# Altium schematic symbol library LATTICEPLDS_Library.SchLib: 291 symbols (part 10 of 32) (continued)
## LFE2M-50-F484_SDT (continued)
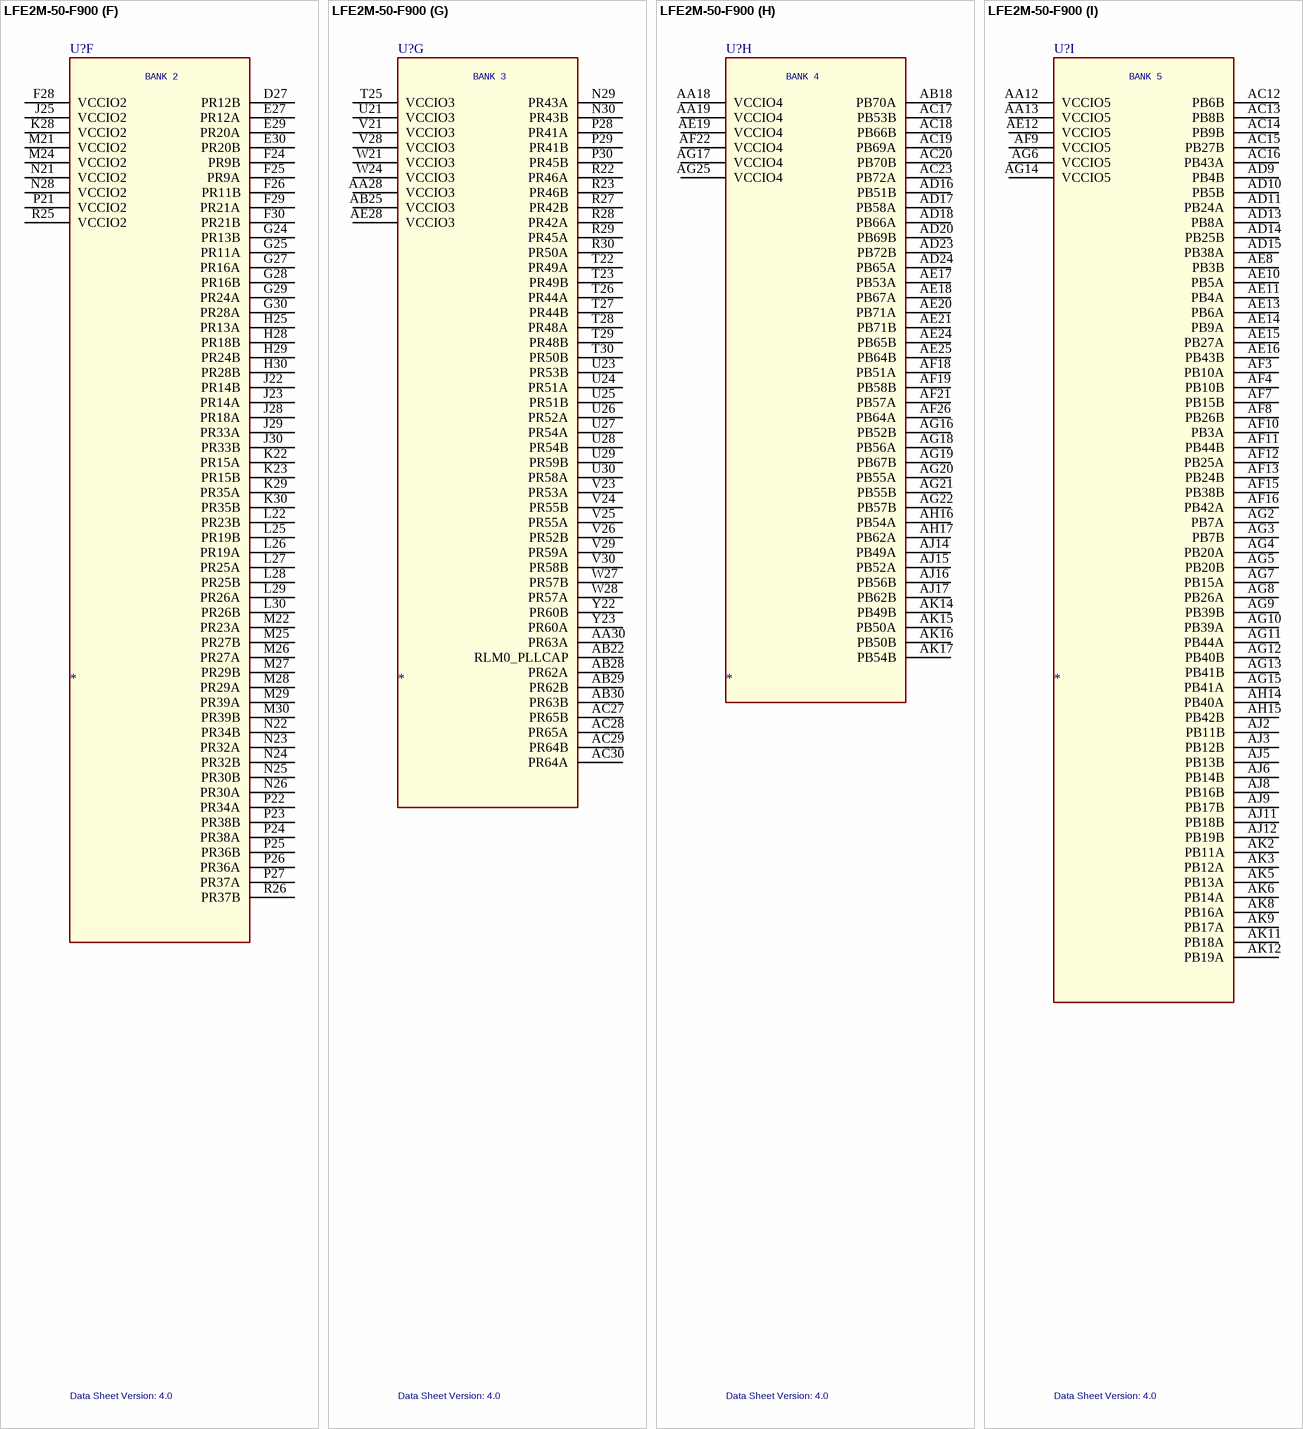
[diagram p110: symbol LFE2M-50-F900]

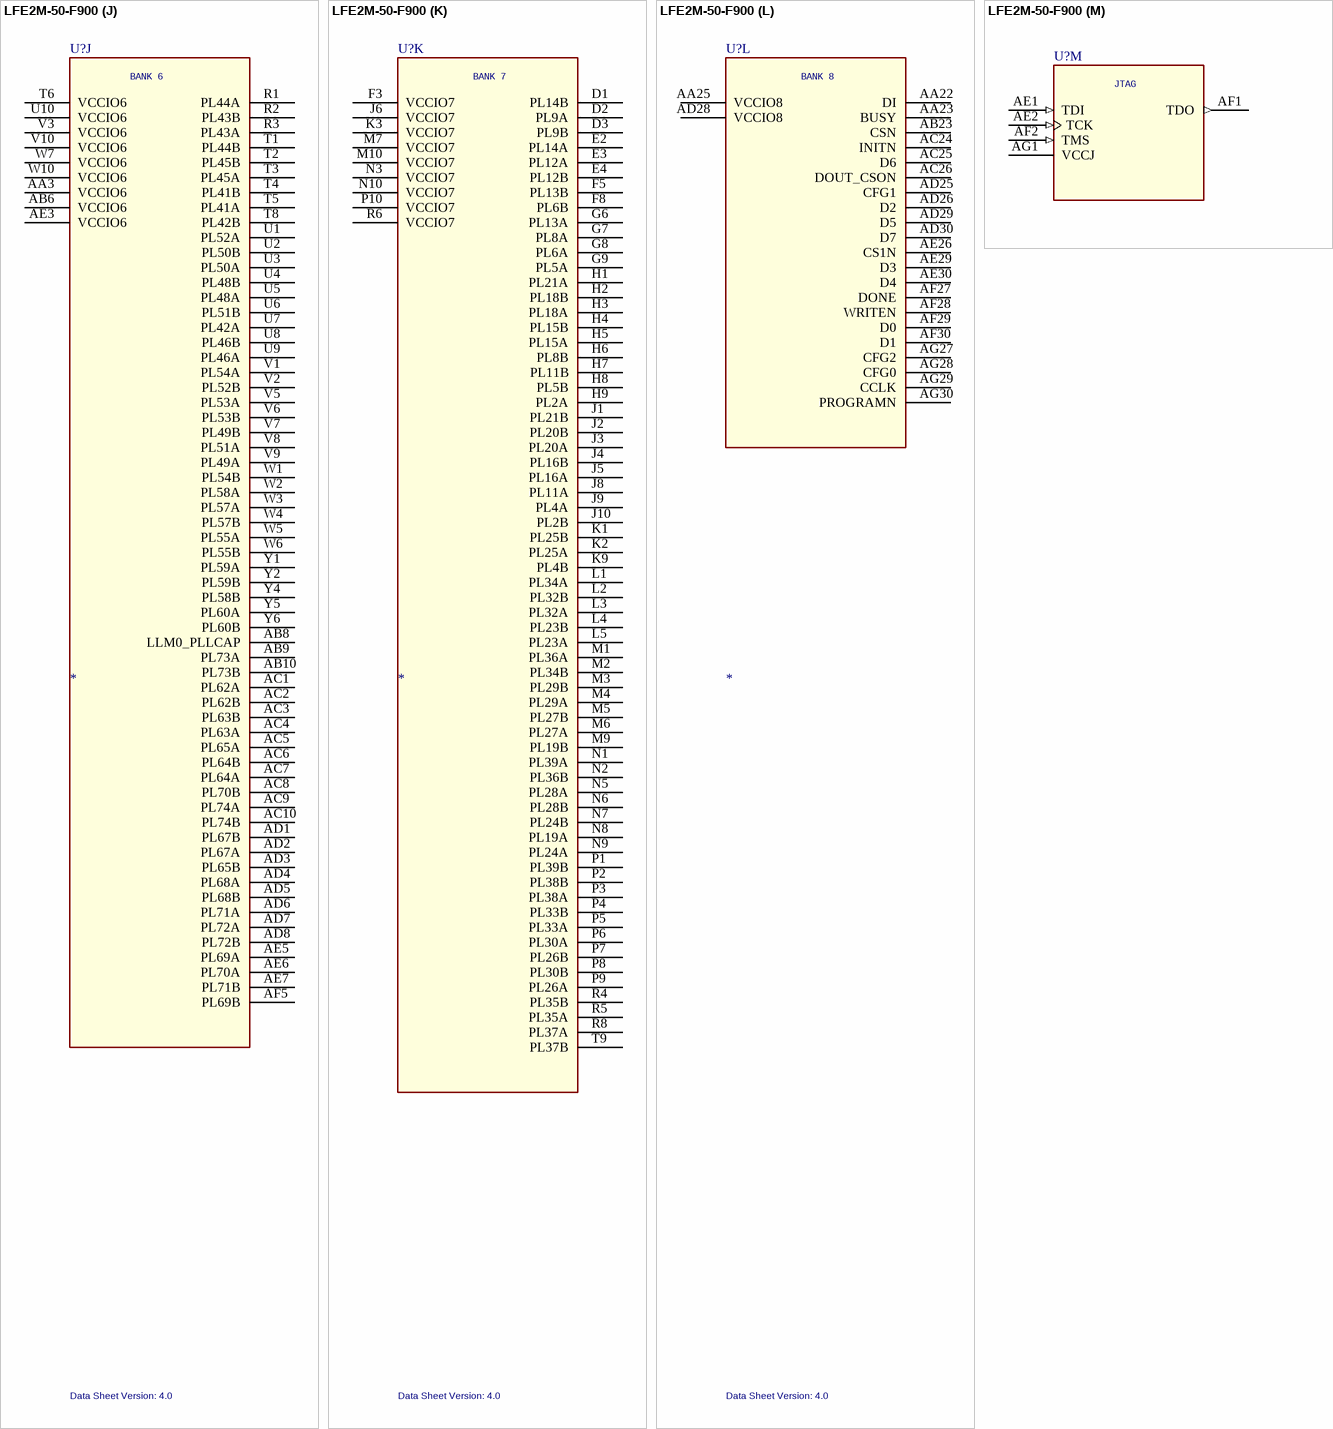
[diagram p111: symbol LFE2M-50-F900]

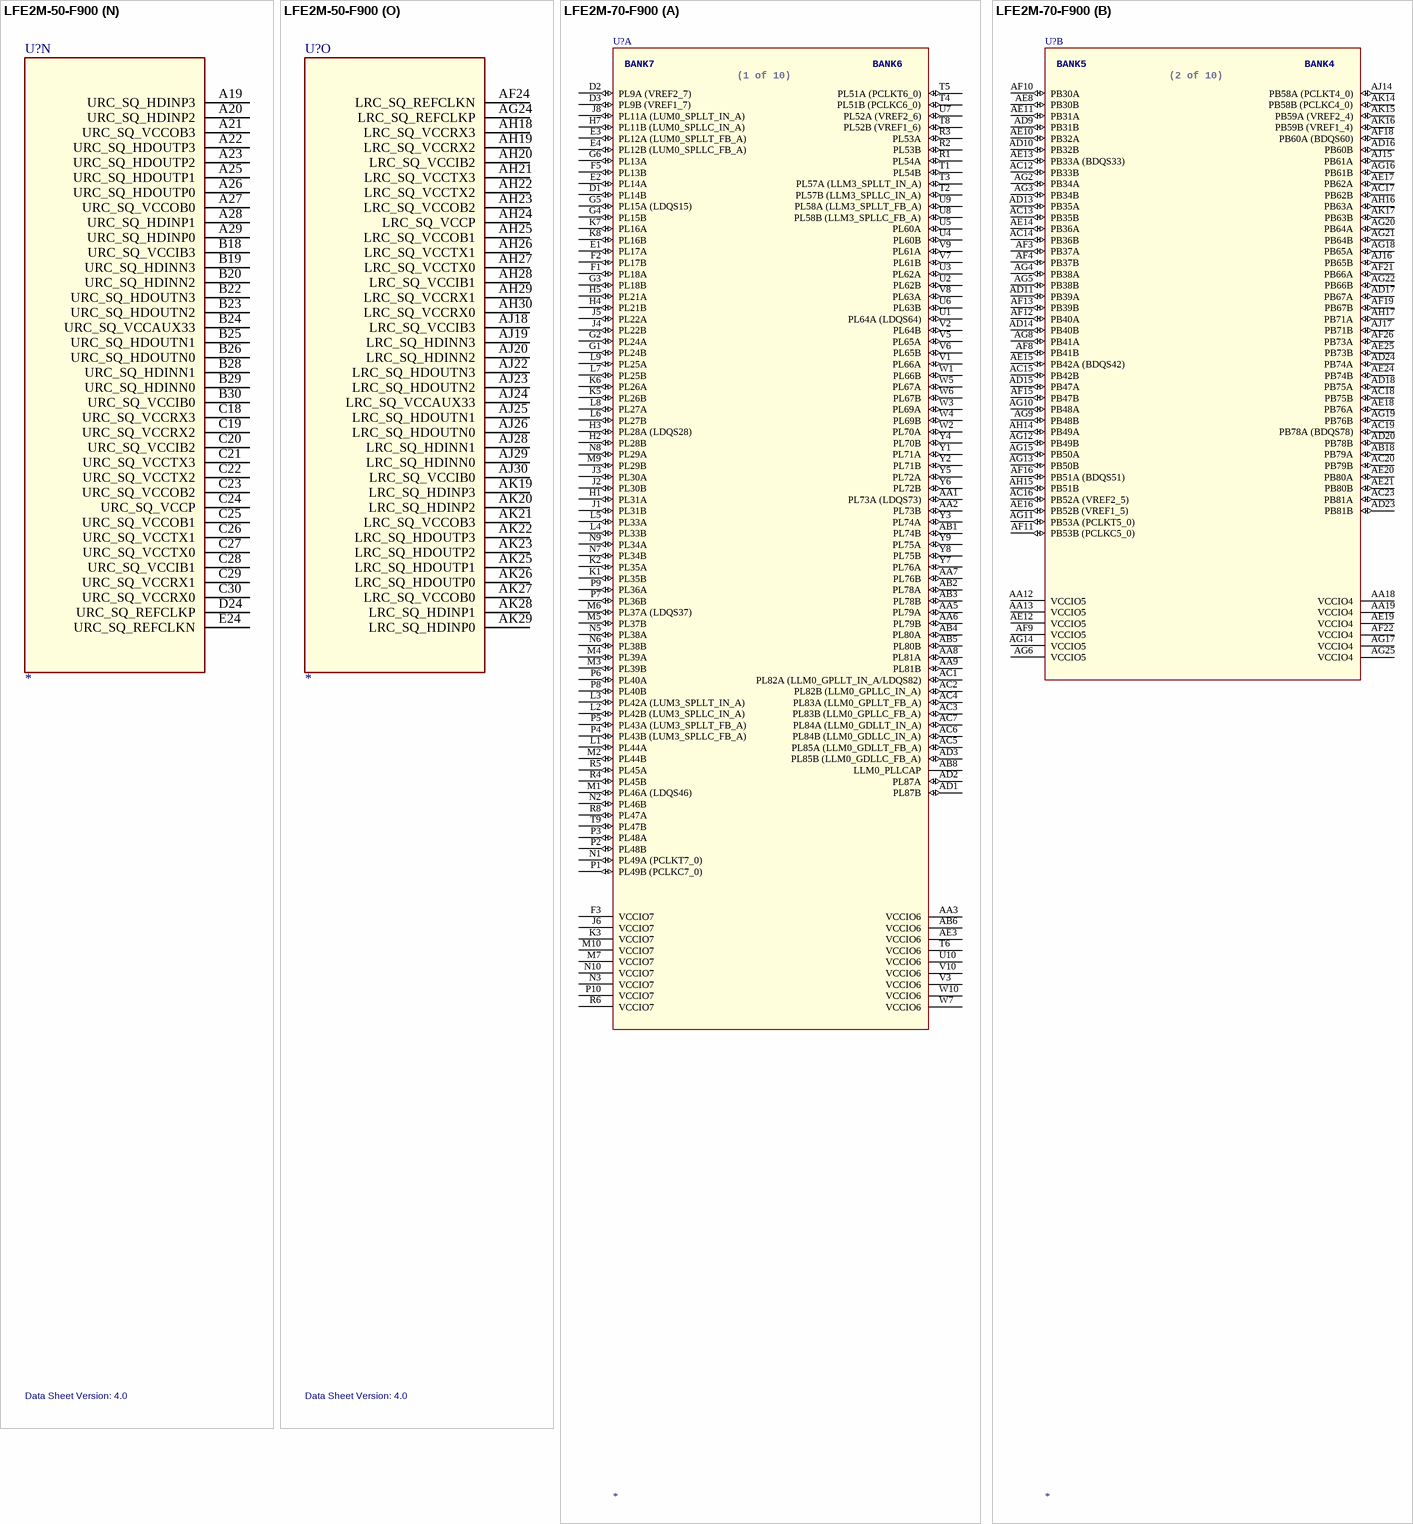
[diagram p112: symbols LFE2M-50-F900 to LFE2M-70-F900]

## LFE2M-50-F900
designator U?  Data Sheet Version: 4.0
SPLIT_INST: TRUE; SWAP_INFO: (S1+S2+S3+S4+S5+S6+S7+S8+S9+S10+S11+S12+S13+S14+S15)
part A pins: AA10 VCCAUX (power), AA11 VCCAUX (power), AA20 VCCAUX (power), AA21 VCCAUX (power), AH1 VCC (power), AH2 VCC (power), AH4 VCC (power), AH5 VCC (power), AH7 VCC (power), AH9 VCC (power), AH10 VCC (power), AH12 VCC (power), AH13 VCC (power), AJ7 VCCAUX (power), B7 VCCAUX (power), C1 VCC (power), C2 VCC (power), C4 VCC (power), C5 VCC (power), C7 VCC (power), C9 VCC (power), C10 VCC (power), C12 VCC (power), C13 VCC (power), G23 XRES, K10 VCCAUX (power), K11 VCCAUX (power), K20 VCCAUX (power), K21 VCCAUX (power), L10 VCCAUX (power), L11 VCCAUX (power), L12 VCC (power), L13 VCC (power), L18 VCC (power), L19 VCC (power), L20 VCCAUX (power), L21 VCCAUX (power), M11 VCC (power), M12 VCC (power), M13 VCC (power), M14 VCC (power), M15 VCC (power), M16 VCC (power), M17 VCC (power), M18 VCC (power), M19 VCC (power), M20 VCC (power), N11 VCC (power), N12 VCC (power), N13 VCCPLL (power), N18 VCCPLL (power), N19 VCC (power), N20 VCC (power), P12 VCC (power), P19 VCC (power), R12 VCC (power), R19 VCC (power), T12 VCC (power), T19 VCC (power), U12 VCC (power), U19 VCC (power), V11 VCC (power), V12 VCC (power), V13 VCCPLL (power), V18 VCCPLL (power), V19 VCC (power), V20 VCC (power), W11 VCC (power), W12 VCC (power), W13 VCC (power), W14 VCC (power), W15 VCC (power), W16 VCC (power), W17 VCC (power), W18 VCC (power), W19 VCC (power), W20 VCC (power), Y10 VCCAUX (power), Y11 VCCAUX (power), Y12 VCC (power), Y13 VCC (power), Y18 VCC (power), Y19 VCC (power), Y20 VCCAUX (power), Y21 VCCAUX (power)
part B pins: A1 GND (power), A7 GND (power), A13 GND (power), A18 GND (power), A24 GND (power), A30 GND (power), AA4 GND (power), AA14 GND (power), AA15 GND (power), AA16 GND (power), AA17 GND (power), AA24 GND (power), AA27 GND (power), AB7 GND (power), AB24 GND (power), AD12 GND (power), AD19 GND (power), AD27 GND (power), AE4 GND (power), AE9 GND (power), AE22 GND (power), AE27 GND (power), AF6 GND (power), AF14 GND (power), AF17 GND (power), AF25 GND (power), AJ4 GND (power), AJ10 GND (power), AJ21 GND (power), AJ27 GND (power), AK1 GND (power), AK7 GND (power), AK13 GND (power), AK18 GND (power), AK24 GND (power), AK30 GND (power), B4 GND (power), B10 GND (power), B21 GND (power), B27 GND (power), D6 GND (power), D25 GND (power), E14 GND (power), E17 GND (power), F4 GND (power), F9 GND (power), F22 GND (power), F27 GND (power), G12 GND (power), G19 GND (power), J7 GND (power), J24 GND (power), K4 GND (power), K14 GND (power), K15 GND (power), K16 GND (power), K17 GND (power), K27 GND (power), L14 GND (power), L15 GND (power), L16 GND (power), L17 GND (power), M8 GND (power), M23 GND (power), N4 GND (power), N14 GND (power), N15 GND (power), N16 GND (power), N17 GND (power), N27 GND (power), P11 GND (power), P13 GND (power), P14 GND (power), P15 GND (power), P16 GND (power), P17 GND (power), P18 GND (power), P20 GND (power), R7 GND (power), R10 GND (power), R11 GND (power), R13 GND (power), R14 GND (power), R15 GND (power), R16 GND (power), R17 GND (power), R18 GND (power), R20 GND (power), R21 GND (power), R24 GND (power), T7 GND (power), T10 GND (power), T11 GND (power), T13 GND (power), T14 GND (power), T15 GND (power), T16 GND (power), T17 GND (power), T18 GND (power), T20 GND (power), T21 GND (power), T24 GND (power), U11 GND (power), U13 GND (power), U14 GND (power), U15 GND (power), U16 GND (power), U17 GND (power), U18 GND (power), U20 GND (power), V4 GND (power), V14 GND (power), V15 GND (power), V16 GND (power), V17 GND (power), V27 GND (power), W8 GND (power), W23 GND (power), Y14 GND (power), Y15 GND (power), Y16 GND (power), Y17 GND (power)
part C pins: A4 NC, A10 NC, AA1 NC, AA2 NC, AA5 NC, AA6 NC, AA7 NC, AA8 NC, AA9 NC, AA26 NC, AA29 NC, AB1 NC, AB2 NC, AB3 NC, AB4 NC, AB5 NC, AB11 NC, AB12 NC, AB13 NC, AB14 NC, AB15 NC, AB16 NC, AB17 NC, AB19 NC, AB20 NC, AB21 NC, AB26 NC, AB27 NC, AC11 NC, AC21 NC, AC22 NC, AD21 NC, AD22 NC, AE23 NC, AF20 NC, AF23 NC, AG23 NC, AG26 NC, AH3 NC, AH6 NC, AH8 NC, AH11 NC, AJ1 NC, AJ13 NC, AK4 NC, AK10 NC, B1 NC, B13 NC, C3 NC, C6 NC, C8 NC, C11 NC, D28 NC, D29 NC, D30 NC, E1 NC, E28 NC, F1 NC, F2 NC, F17 NC, F18 NC, F20 NC, F23 NC, G1 NC, G2 NC, G3 NC, G4 NC, G5 NC, G10 NC, G20 NC, G21 NC, G26 NC, H17 NC, H19 NC, H20 NC, H21 NC, H22 NC, H23 NC, H24 NC, H26 NC, H27 NC, J17 NC, J18 NC, J19 NC, J20 NC, J21 NC, J26 NC, J27 NC, K5 NC, K6 NC, K7 NC, K8 NC, K24 NC, K25 NC, K26 NC, L6 NC, L7 NC, L8 NC, L9 NC, L23 NC, L24 NC, R9 NC, U22 NC, V22 NC, W9 NC, W22 NC, W25 NC, W26 NC, W29 NC, W30 NC, Y3 NC, Y7 NC, Y8 NC, Y9 NC, Y24 NC, Y25 NC, Y26 NC, Y27 NC, Y28 NC, Y29 NC, Y30 NC
part D pins: A2 PT11A, A3 PT12A, A5 PT13A, A6 PT14A, A8 PT18A, A9 PT17A, A11 PT16A, A12 PT19A, A14 PT42B, B2 PT11B, B3 PT12B, B5 PT13B, B6 PT14B, B8 PT18B, B9 PT17B, B11 PT16B, B12 PT19B, B14 PT42A, C14 PT45B, C15 PT46B, D4 PT38B, D5 PT38A, D7 PT15A, D8 PT34A, D9 PT30A, D10 PT10A, D11 PT4A, D12 PT28B, D13 PT41B, D14 VCCIO0 (power), D15 PT46A, E5 PT37B, E6 VCCIO0 (power), E7 PT15B, E8 PT30B, E9 VCCIO0 (power), E10 PT9B, E11 PT10B, E12 PT4B, E13 PT28A, E15 PT45A, F6 PT37A, F7 PT34B, F10 PT9A, F11 PT3A, F12 VCCIO0 (power), F13 PT41A, F14 PT43B, G11 PT32A, G13 PT40B, G14 PT44B, H10 PT5A, H11 PT3B, H12 PT31A, H13 PT31B, H14 PT43A, J11 PT40A, J12 PT5B, J13 PT32B, J14 PT44A
part E pins: A15 PT48B, A16 PT54B, A17 PT64B, B15 PT48A, B16 PT54A, B17 PT64A, C16 PT50B, C17 PT65A, D16 PT50A, D17 VCCIO1 (power), D18 PT65B, D19 PT66B, D20 PT68B, D21 PT68A, D22 PT70B, D23 PT73B, D26 PT72B, E16 PT47A, E18 PT66A, E19 PT67A, E20 PT67B, E21 PT73A, E22 VCCIO1 (power), E23 PT71B, E25 VCCIO1 (power), E26 PT72A, F15 PT47B, F16 PT52A, F19 VCCIO1 (power), F21 PT70A, G15 PT51A, G16 PT53A, G17 PT53B, G18 PT69B, G22 PT71A, H15 PT49A, H16 PT52B, H18 PT69A, J15 PT49B, J16 PT51B, K12 VCCIO0 (power), K13 VCCIO0 (power), K18 VCCIO1 (power), K19 VCCIO1 (power)
part F pins: D27 PR12B, E27 PR12A, E29 PR20A, E30 PR20B, F24 PR9B, F25 PR9A, F26 PR11B, F28 VCCIO2 (power), F29 PR21A, F30 PR21B, G24 PR13B, G25 PR11A, G27 PR16A, G28 PR16B, G29 PR24A, G30 PR28A, H25 PR13A, H28 PR18B, H29 PR24B, H30 PR28B, J22 PR14B, J23 PR14A, J25 VCCIO2 (power), J28 PR18A, J29 PR33A, J30 PR33B, K22 PR15A, K23 PR15B, K28 VCCIO2 (power), K29 PR35A, K30 PR35B, L22 PR23B, L25 PR19B, L26 PR19A, L27 PR25A, L28 PR25B, L29 PR26A, L30 PR26B, M21 VCCIO2 (power), M22 PR23A, M24 VCCIO2 (power), M25 PR27B, M26 PR27A, M27 PR29B, M28 PR29A, M29 PR39A, M30 PR39B, N21 VCCIO2 (power), N22 PR34B, N23 PR32A, N24 PR32B, N25 PR30B, N26 PR30A, N28 VCCIO2 (power), P21 VCCIO2 (power), P22 PR34A, P23 PR38B, P24 PR38A, P25 PR36B, P26 PR36A, P27 PR37A, R25 VCCIO2 (power), R26 PR37B
part G pins: AA28 VCCIO3 (power), AA30 PR63A, AB22 RLM0_PLLCAP, AB25 VCCIO3 (power), AB28 PR62A, AB29 PR62B, AB30 PR63B, AC27 PR65B, AC28 PR65A, AC29 PR64B, AC30 PR64A, AE28 VCCIO3 (power), N29 PR43A, N30 PR43B, P28 PR41A, P29 PR41B, P30 PR45B, R22 PR46A, R23 PR46B, R27 PR42B, R28 PR42A, R29 PR45A, R30 PR50A, T22 PR49A, T23 PR49B, T25 VCCIO3 (power), T26 PR44A, T27 PR44B, T28 PR48A, T29 PR48B, T30 PR50B, U21 VCCIO3 (power), U23 PR53B, U24 PR51A, U25 PR51B, U26 PR52A, U27 PR54A, U28 PR54B, U29 PR59B, U30 PR58A, V21 VCCIO3 (power), V23 PR53A, V24 PR55B, V25 PR55A, V26 PR52B, V28 VCCIO3 (power), V29 PR59A, V30 PR58B, W21 VCCIO3 (power), W24 VCCIO3 (power), W27 PR57B, W28 PR57A, Y22 PR60B, Y23 PR60A
part H pins: AA18 VCCIO4 (power), AA19 VCCIO4 (power), AB18 PB70A, AC17 PB53B, AC18 PB66B, AC19 PB69A, AC20 PB70B, AC23 PB72A, AD16 PB51B, AD17 PB58A, AD18 PB66A, AD20 PB69B, AD23 PB72B, AD24 PB65A, AE17 PB53A, AE18 PB67A, AE19 VCCIO4 (power), AE20 PB71A, AE21 PB71B, AE24 PB65B, AE25 PB64B, AF18 PB51A, AF19 PB58B, AF21 PB57A, AF22 VCCIO4 (power), AF26 PB64A, AG16 PB52B, AG17 VCCIO4 (power), AG18 PB56A, AG19 PB67B, AG20 PB55A, AG21 PB55B, AG22 PB57B, AG25 VCCIO4 (power), AH16 PB54A, AH17 PB62A, AJ14 PB49A, AJ15 PB52A, AJ16 PB56B, AJ17 PB62B, AK14 PB49B, AK15 PB50A, AK16 PB50B, AK17 PB54B
part I pins: AA12 VCCIO5 (power), AA13 VCCIO5 (power), AC12 PB6B, AC13 PB8B, AC14 PB9B, AC15 PB27B, AC16 PB43A, AD9 PB4B, AD10 PB5B, AD11 PB24A, AD13 PB8A, AD14 PB25B, AD15 PB38A, AE8 PB3B, AE10 PB5A, AE11 PB4A, AE12 VCCIO5 (power), AE13 PB6A, AE14 PB9A, AE15 PB27A, AE16 PB43B, AF3 PB10A, AF4 PB10B, AF7 PB15B, AF8 PB26B, AF9 VCCIO5 (power), AF10 PB3A, AF11 PB44B, AF12 PB25A, AF13 PB24B, AF15 PB38B, AF16 PB42A, AG2 PB7A, AG3 PB7B, AG4 PB20A, AG5 PB20B, AG6 VCCIO5 (power), AG7 PB15A, AG8 PB26A, AG9 PB39B, AG10 PB39A, AG11 PB44A, AG12 PB40B, AG13 PB41B, AG14 VCCIO5 (power), AG15 PB41A, AH14 PB40A, AH15 PB42B, AJ2 PB11B, AJ3 PB12B, AJ5 PB13B, AJ6 PB14B, AJ8 PB16B, AJ9 PB17B, AJ11 PB18B, AJ12 PB19B, AK2 PB11A, AK3 PB12A, AK5 PB13A, AK6 PB14A, AK8 PB16A, AK9 PB17A, AK11 PB18A, AK12 PB19A
part J pins: AA3 VCCIO6 (power), AB6 VCCIO6 (power), AB8 LLM0_PLLCAP, AB9 PL73A, AB10 PL73B, AC1 PL62A, AC2 PL62B, AC3 PL63B, AC4 PL63A, AC5 PL65A, AC6 PL64B, AC7 PL64A, AC8 PL70B, AC9 PL74A, AC10 PL74B, AD1 PL67B, AD2 PL67A, AD3 PL65B, AD4 PL68A, AD5 PL68B, AD6 PL71A, AD7 PL72A, AD8 PL72B, AE3 VCCIO6 (power), AE5 PL69A, AE6 PL70A, AE7 PL71B, AF5 PL69B, R1 PL44A, R2 PL43B, R3 PL43A, T1 PL44B, T2 PL45B, T3 PL45A, T4 PL41B, T5 PL41A, T6 VCCIO6 (power), T8 PL42B, U1 PL52A, U2 PL50B, U3 PL50A, U4 PL48B, U5 PL48A, U6 PL51B, U7 PL42A, U8 PL46B, U9 PL46A, U10 VCCIO6 (power), V1 PL54A, V2 PL52B, V3 VCCIO6 (power), V5 PL53A, V6 PL53B, V7 PL49B, V8 PL51A, V9 PL49A, V10 VCCIO6 (power), W1 PL54B, W2 PL58A, W3 PL57A, W4 PL57B, W5 PL55A, W6 PL55B, W7 VCCIO6 (power), W10 VCCIO6 (power), Y1 PL59A, Y2 PL59B, Y4 PL58B, Y5 PL60A, Y6 PL60B
part K pins: D1 PL14B, D2 PL9A, D3 PL9B, E2 PL14A, E3 PL12A, E4 PL12B, F3 VCCIO7 (power), F5 PL13B, F8 PL6B, G6 PL13A, G7 PL8A, G8 PL6A, G9 PL5A, H1 PL21A, H2 PL18B, H3 PL18A, H4 PL15B, H5 PL15A, H6 PL8B, H7 PL11B, H8 PL5B, H9 PL2A, J1 PL21B, J2 PL20B, J3 PL20A, J4 PL16B, J5 PL16A, J6 VCCIO7 (power), J8 PL11A, J9 PL4A, J10 PL2B, K1 PL25B, K2 PL25A, K3 VCCIO7 (power), K9 PL4B, L1 PL34A, L2 PL32B, L3 PL32A, L4 PL23B, L5 PL23A, M1 PL36A, M2 PL34B, M3 PL29B, M4 PL29A, M5 PL27B, M6 PL27A, M7 VCCIO7 (power), M9 PL19B, M10 VCCIO7 (power), N1 PL39A, N2 PL36B, N3 VCCIO7 (power), N5 PL28A, N6 PL28B, N7 PL24B, N8 PL19A, N9 PL24A, N10 VCCIO7 (power), P1 PL39B, P2 PL38B, P3 PL38A, P4 PL33B, P5 PL33A, P6 PL30A, P7 PL26B, P8 PL30B, P9 PL26A, P10 VCCIO7 (power), R4 PL35B, R5 PL35A, R6 VCCIO7 (power), R8 PL37A, T9 PL37B
part L pins: AA22 DI, AA23 BUSY, AA25 VCCIO8 (power), AB23 CSN, AC24 INITN, AC25 D6, AC26 DOUT_CSON, AD25 CFG1, AD26 D2, AD28 VCCIO8 (power), AD29 D5, AD30 D7, AE26 CS1N, AE29 D3, AE30 D4, AF27 DONE, AF28 WRITEN, AF29 D0, AF30 D1, AG27 CFG2, AG28 CFG0, AG29 CCLK, AG30 PROGRAMN
part M pins: AE1 TDI (in), AE2 TCK (in), AF1 TDO (out), AF2 TMS (in), AG1 VCCJ (power)
part N pins: A19 URC_SQ_HDINP3, A20 URC_SQ_HDINP2, A21 URC_SQ_VCCOB3, A22 URC_SQ_HDOUTP3, A23 URC_SQ_HDOUTP2, A25 URC_SQ_HDOUTP1, A26 URC_SQ_HDOUTP0, A27 URC_SQ_VCCOB0, A28 URC_SQ_HDINP1, A29 URC_SQ_HDINP0, B18 URC_SQ_VCCIB3, B19 URC_SQ_HDINN3, B20 URC_SQ_HDINN2, B22 URC_SQ_HDOUTN3, B23 URC_SQ_HDOUTN2, B24 URC_SQ_VCCAUX33, B25 URC_SQ_HDOUTN1, B26 URC_SQ_HDOUTN0, B28 URC_SQ_HDINN1, B29 URC_SQ_HDINN0, B30 URC_SQ_VCCIB0, C18 URC_SQ_VCCRX3, C19 URC_SQ_VCCRX2, C20 URC_SQ_VCCIB2, C21 URC_SQ_VCCTX3, C22 URC_SQ_VCCTX2, C23 URC_SQ_VCCOB2, C24 URC_SQ_VCCP, C25 URC_SQ_VCCOB1, C26 URC_SQ_VCCTX1, C27 URC_SQ_VCCTX0, C28 URC_SQ_VCCIB1, C29 URC_SQ_VCCRX1, C30 URC_SQ_VCCRX0, D24 URC_SQ_REFCLKP, E24 URC_SQ_REFCLKN
part O pins: AF24 LRC_SQ_REFCLKN, AG24 LRC_SQ_REFCLKP, AH18 LRC_SQ_VCCRX3, AH19 LRC_SQ_VCCRX2, AH20 LRC_SQ_VCCIB2, AH21 LRC_SQ_VCCTX3, AH22 LRC_SQ_VCCTX2, AH23 LRC_SQ_VCCOB2, AH24 LRC_SQ_VCCP, AH25 LRC_SQ_VCCOB1, AH26 LRC_SQ_VCCTX1, AH27 LRC_SQ_VCCTX0, AH28 LRC_SQ_VCCIB1, AH29 LRC_SQ_VCCRX1, AH30 LRC_SQ_VCCRX0, AJ18 LRC_SQ_VCCIB3, AJ19 LRC_SQ_HDINN3, AJ20 LRC_SQ_HDINN2, AJ22 LRC_SQ_HDOUTN3, AJ23 LRC_SQ_HDOUTN2, AJ24 LRC_SQ_VCCAUX33, AJ25 LRC_SQ_HDOUTN1, AJ26 LRC_SQ_HDOUTN0, AJ28 LRC_SQ_HDINN1, AJ29 LRC_SQ_HDINN0, AJ30 LRC_SQ_VCCIB0, AK19 LRC_SQ_HDINP3, AK20 LRC_SQ_HDINP2, AK21 LRC_SQ_VCCOB3, AK22 LRC_SQ_HDOUTP3, AK23 LRC_SQ_HDOUTP2, AK25 LRC_SQ_HDOUTP1, AK26 LRC_SQ_HDOUTP0, AK27 LRC_SQ_VCCOB0, AK28 LRC_SQ_HDINP1, AK29 LRC_SQ_HDINP0
part D text: BANK 0
part E text: BANK 1
part F text: BANK 2
part G text: BANK 3
part H text: BANK 4
part I text: BANK 5
part J text: BANK 6
part K text: BANK 7
part L text: BANK 8
part M text: JTAG

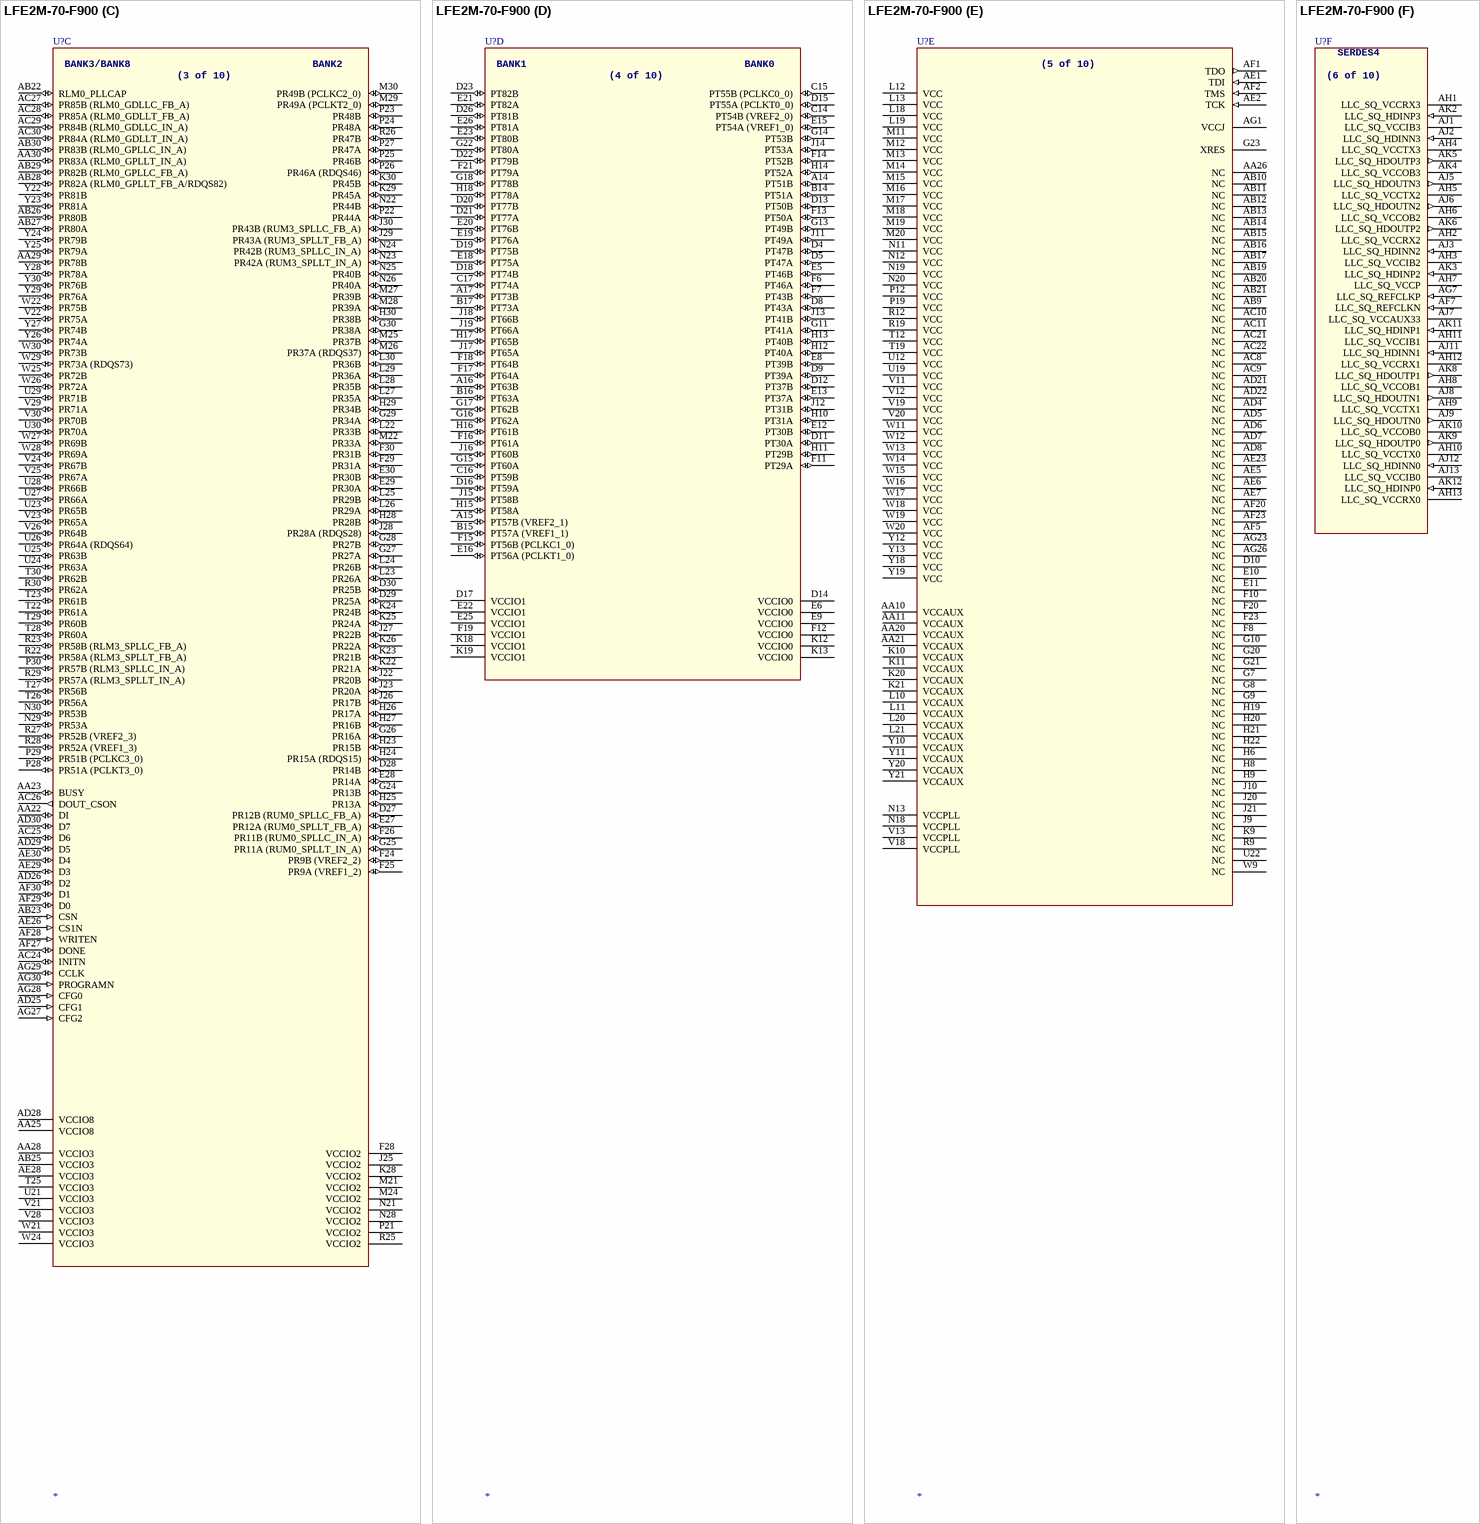
[diagram p113: symbol LFE2M-70-F900]

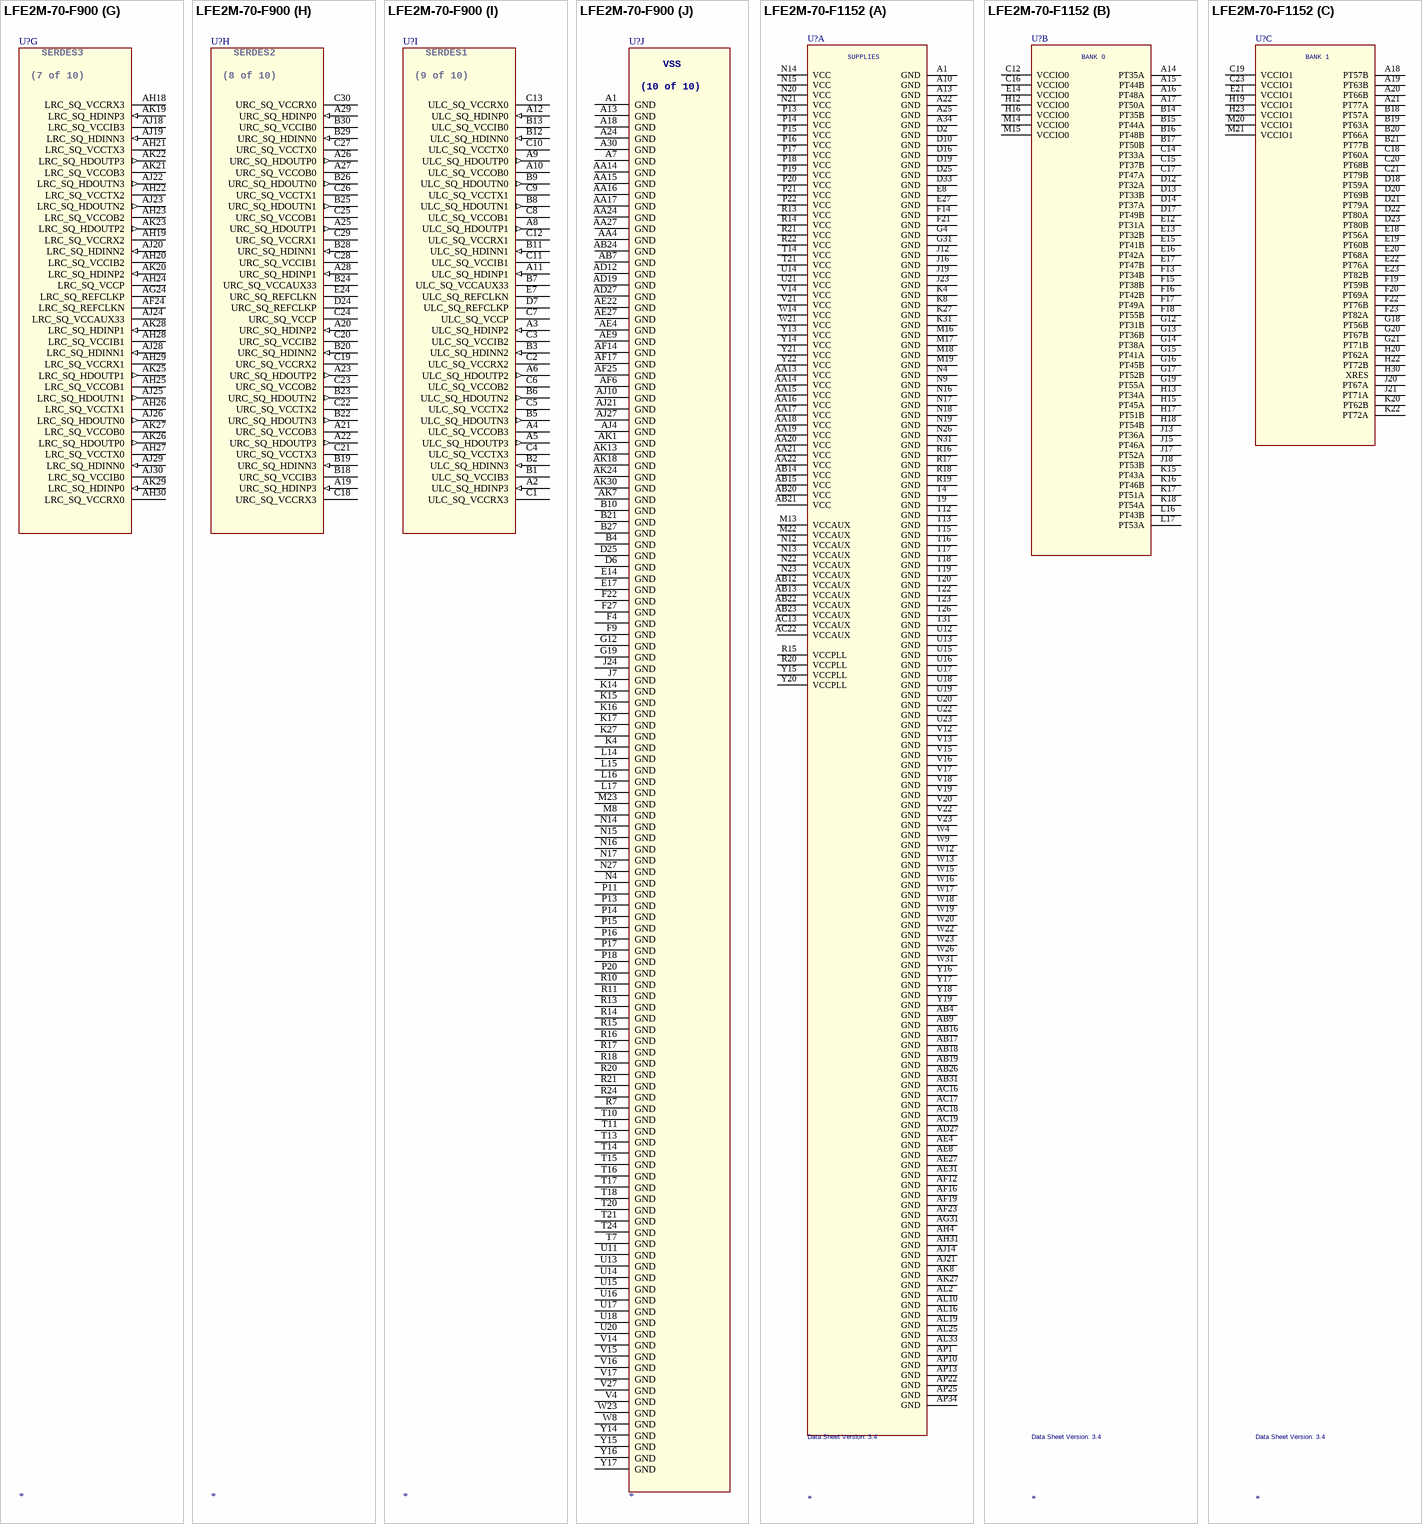
[diagram p114: symbols LFE2M-70-F900 to LFE2M-70-F1152]